# Altium footprint library LukaLIBRARY.PcbLib: 784 footprints (part 8 of 49)
Each footprint in its own frame and in the unit in brackets; x right, y up, seen from the top. Pads: shape width x height; smd on the part's side, far side on the other; paste and mask are expansions set on the pad; w line width, h text height; cw(c..) or ccw(c..) is an arc to the next point about the centre after c.
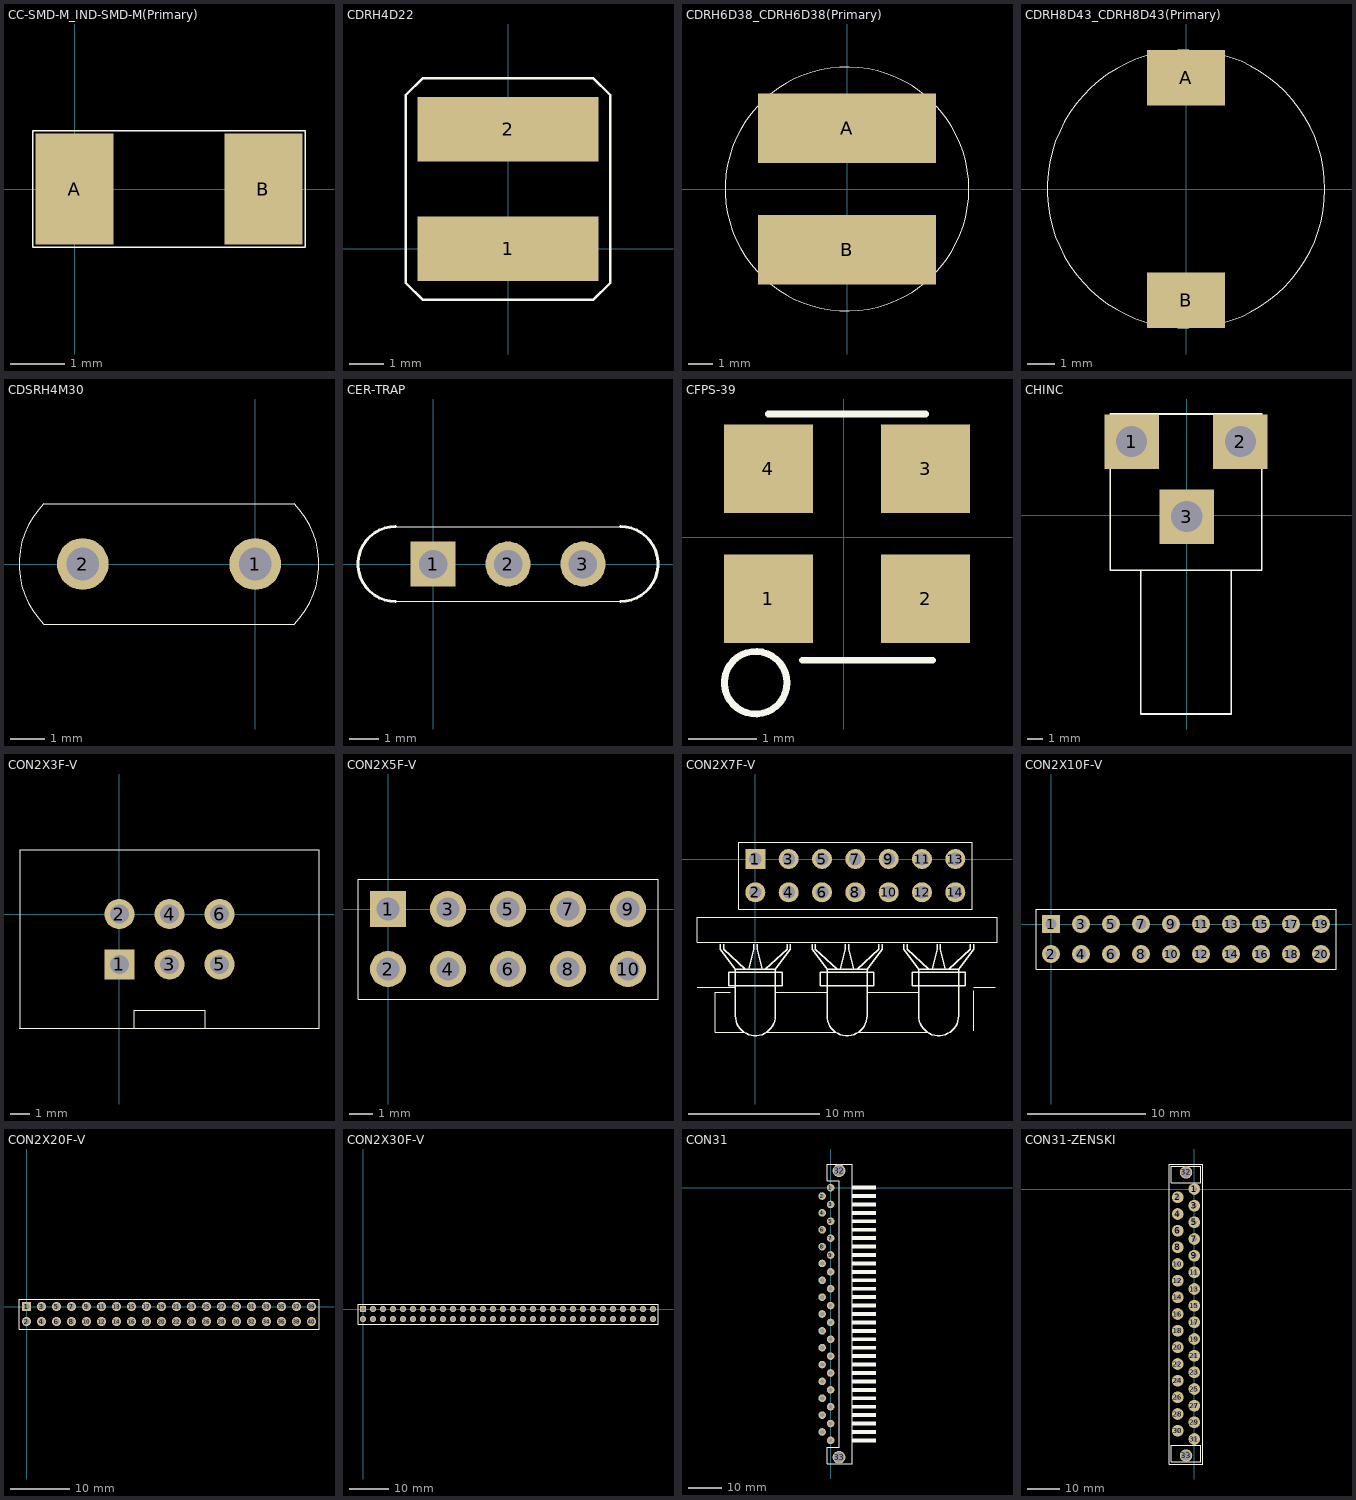
[diagram p7: the footprints below, top view; thin cyan lines are the x and y axes]

## CC-SMD-M_IND-SMD-M(Primary) [mil]
pads (2):
  rect 56x80 smd mask-1000: A(0,0) B(136,0)
Top Overlay:
  lines w1: -30,-42 166,-42 166,42 -30,42 -30,-42
Top Solder:
  region: -28,-40 28,-40 28,40 -28,40
  region: 108,-40 164,-40 164,40 108,40

## CDRH4D22 [mm]
pads (2):
  rect 5.3x1.9 smd mask-25.4: 1(0,0) 2(0,3.5)
Top Overlay:
  lines w0.076: -3,3.5 -3,4.5 -2.5,5 2.5,5 3,4.5 3,4 3,-1 2.5,-1.5 2,-1.5 -2.5,-1.5 -3,-1 -3,4
Top Solder:
  region: -2.65,-0.95 2.65,-0.95 2.65,0.95 -2.65,0.95
  region: -2.65,2.55 2.65,2.55 2.65,4.45 -2.65,4.45

## CDRH6D38_CDRH6D38(Primary) [mm]
pads (2):
  rect 7.3x2.85 smd mask-25.4: A(0,2.5) B(0,-2.5)
Top Overlay:
  circle w0.01: c0,0 r5
Top Solder:
  region: -3.65,1.075 3.65,1.075 3.65,3.925 -3.65,3.925
  region: -3.65,-3.925 3.65,-3.925 3.65,-1.075 -3.65,-1.075

## CDRH8D43_CDRH8D43(Primary) [mm]
pads (2):
  rect 2.8x2 smd mask-25.4: A(0,4) B(0,-4)
Top Overlay:
  circle w0.01: c0,0 r5
Top Solder:
  region: -1.4,-5 1.4,-5 1.4,-3 -1.4,-3
  region: -1.4,3 1.4,3 1.4,5 -1.4,5

## CDSRH4M30 [mil]
pads (2):
  round 60 hole 38: 1(0,0) 2(-200,0)
Top Overlay:
  lines w1: -245,-70 cw(c-175,0) -245,70 45,70 cw(c-25,0) 45,-70 -245,-70

## CER-TRAP [mil]
pads (3):
  rect 60x60 hole 38 mask-1000: 1(0,0)
  round 60 hole 38 mask-1000: 2(100,0) 3(200,0)
Top Overlay:
  lines w1: -50,-50 250,-50 ; -50,50 250,50
  lines w3.94: -50,-50 cw(c-50,0) -50,50 ; 250,-50 ccw(c250,0) 250,50
Top Solder:
  region: 100,30.26 92.17,29.23 84.87,26.2 78.6,21.4 73.8,15.13 70.77,7.83 69.74,0 70.77,-7.83 73.8,-15.13 78.6,-21.4 84.87,-26.2 92.17,-29.23 100,-30.26 107.83,-29.23 115.13,-26.2 121.4,-21.4 126.2,-15.13 129.23,-7.83 130.26,0 129.23,7.83 126.2,15.13 121.4,21.4 115.13,26.2 107.83,29.23
  region: 200,30.26 192.17,29.23 184.87,26.2 178.6,21.4 173.79,15.13 170.77,7.83 169.74,0 170.77,-7.83 173.79,-15.13 178.6,-21.4 184.87,-26.2 192.17,-29.23 200,-30.26 207.83,-29.23 215.13,-26.2 221.4,-21.4 226.21,-15.13 229.23,-7.83 230.26,0 229.23,7.83 226.21,15.13 221.4,21.4 215.13,26.2 207.83,29.23
  region: -30,-30 30,-30 30,30 -30,30
Bottom Solder:
  region: 100,30.26 92.17,29.23 84.87,26.2 78.6,21.4 73.8,15.13 70.77,7.83 69.74,0 70.77,-7.83 73.8,-15.13 78.6,-21.4 84.87,-26.2 92.17,-29.23 100,-30.26 107.83,-29.23 115.13,-26.2 121.4,-21.4 126.2,-15.13 129.23,-7.83 130.26,0 129.23,7.83 126.2,15.13 121.4,21.4 115.13,26.2 107.83,29.23
  region: 200,30.26 192.17,29.23 184.87,26.2 178.6,21.4 173.79,15.13 170.77,7.83 169.74,0 170.77,-7.83 173.79,-15.13 178.6,-21.4 184.87,-26.2 192.17,-29.23 200,-30.26 207.83,-29.23 215.13,-26.2 221.4,-21.4 226.21,-15.13 229.23,-7.83 230.26,0 229.23,7.83 226.21,15.13 221.4,21.4 215.13,26.2 207.83,29.23
  region: -30,-30 30,-30 30,30 -30,30

## CFPS-39 [mm]
pads (4):
  rect 1.3x1.3 smd mask-25.4: 1(-1.1,-0.9) 2(1.2,-0.9) 3(1.2,1) 4(-1.1,1)
Top Overlay:
  circle w0.1: c-1.285,-2.128 r0.457
  lines w0.1: -1.1,1.8 1.2,1.8 ; -0.6,-1.8 1.3,-1.8
Top Solder:
  region: 0.55,-1.55 1.85,-1.55 1.85,-0.25 0.55,-0.25
  region: 0.55,0.35 1.85,0.35 1.85,1.65 0.55,1.65
  region: -1.75,-1.55 -0.45,-1.55 -0.45,-0.25 -1.75,-0.25
  region: -1.75,0.35 -0.45,0.35 -0.45,1.65 -1.75,1.65

## CHINC [mil]
pads (3):
  rect 140x140 hole 80 mask-1000: 1(-141.73,188.98) 2(137.8,188.98) 3(0,-3.94)
Top Layer:
  lines w3.94: 192.91,188.98 192.91,259.84
Top Overlay:
  lines w3.94: -196.85,-141.73 -118.11,-141.73 -118.11,-511.81 114.17,-511.81 114.17,-141.73 192.91,-141.73 ; -196.85,-141.73 -196.85,259.84 192.91,259.84 192.91,-141.73 ; -196.85,-141.73 192.91,-141.73
Top Solder:
  region: -211.73,118.98 -71.73,118.98 -71.73,258.98 -211.73,258.98
  region: -70,-73.94 70,-73.94 70,66.06 -70,66.06
  region: 67.8,118.98 207.8,118.98 207.8,258.98 67.8,258.98
Bottom Solder:
  region: -211.73,118.98 -71.73,118.98 -71.73,258.98 -211.73,258.98
  region: -70,-73.94 70,-73.94 70,66.06 -70,66.06
  region: 67.8,118.98 207.8,118.98 207.8,258.98 67.8,258.98

## CON2X3F-V [mil]
pads (6):
  rect 60x60 hole 38 mask-1000: 1(0,-100)
  round 60 hole 38 mask-1000: 2(0,0) 3(100,-100) 4(100,0) 5(200,-100) 6(200,0)
Top Overlay:
  lines w0.98: -200,-227 398,-227 398,128 -198,128 -198,-227 ; 30,-226 30,-192 171,-192 171,-227
Top Solder:
  region: 100,30.26 92.17,29.23 84.87,26.2 78.6,21.4 73.8,15.13 70.77,7.83 69.74,0 70.77,-7.83 73.8,-15.13 78.6,-21.4 84.87,-26.2 92.17,-29.23 100,-30.26 107.83,-29.23 115.13,-26.2 121.4,-21.4 126.2,-15.13 129.23,-7.83 130.26,0 129.23,7.83 126.2,15.13 121.4,21.4 115.13,26.2 107.83,29.23
  region: 100,-69.74 92.17,-70.77 84.87,-73.8 78.6,-78.6 73.8,-84.87 70.77,-92.17 69.74,-100 70.77,-107.83 73.8,-115.13 78.6,-121.4 84.87,-126.2 92.17,-129.23 100,-130.26 107.83,-129.23 115.13,-126.2 121.4,-121.4 126.2,-115.13 129.23,-107.83 130.26,-100 129.23,-92.17 126.2,-84.87 121.4,-78.6 115.13,-73.8 107.83,-70.77
  region: 200,30.26 192.17,29.23 184.87,26.2 178.6,21.4 173.79,15.13 170.77,7.83 169.74,0 170.77,-7.83 173.79,-15.13 178.6,-21.4 184.87,-26.2 192.17,-29.23 200,-30.26 207.83,-29.23 215.13,-26.2 221.4,-21.4 226.21,-15.13 229.23,-7.83 230.26,0 229.23,7.83 226.21,15.13 221.4,21.4 215.13,26.2 207.83,29.23
  region: 0,30.26 -7.83,29.23 -15.13,26.2 -21.4,21.4 -26.2,15.13 -29.23,7.83 -30.26,0 -29.23,-7.83 -26.2,-15.13 -21.4,-21.4 -15.13,-26.2 -7.83,-29.23 0,-30.26 7.83,-29.23 15.13,-26.2 21.4,-21.4 26.2,-15.13 29.23,-7.83 30.26,0 29.23,7.83 26.2,15.13 21.4,21.4 15.13,26.2 7.83,29.23
  region: 200,-69.74 192.17,-70.77 184.87,-73.8 178.6,-78.6 173.79,-84.87 170.77,-92.17 169.74,-100 170.77,-107.83 173.79,-115.13 178.6,-121.4 184.87,-126.2 192.17,-129.23 200,-130.26 207.83,-129.23 215.13,-126.2 221.4,-121.4 226.21,-115.13 229.23,-107.83 230.26,-100 229.23,-92.17 226.21,-84.87 221.4,-78.6 215.13,-73.8 207.83,-70.77
  region: -30,-130 30,-130 30,-70 -30,-70
Bottom Solder:
  region: 100,30.26 92.17,29.23 84.87,26.2 78.6,21.4 73.8,15.13 70.77,7.83 69.74,0 70.77,-7.83 73.8,-15.13 78.6,-21.4 84.87,-26.2 92.17,-29.23 100,-30.26 107.83,-29.23 115.13,-26.2 121.4,-21.4 126.2,-15.13 129.23,-7.83 130.26,0 129.23,7.83 126.2,15.13 121.4,21.4 115.13,26.2 107.83,29.23
  region: 100,-69.74 92.17,-70.77 84.87,-73.8 78.6,-78.6 73.8,-84.87 70.77,-92.17 69.74,-100 70.77,-107.83 73.8,-115.13 78.6,-121.4 84.87,-126.2 92.17,-129.23 100,-130.26 107.83,-129.23 115.13,-126.2 121.4,-121.4 126.2,-115.13 129.23,-107.83 130.26,-100 129.23,-92.17 126.2,-84.87 121.4,-78.6 115.13,-73.8 107.83,-70.77
  region: 200,30.26 192.17,29.23 184.87,26.2 178.6,21.4 173.79,15.13 170.77,7.83 169.74,0 170.77,-7.83 173.79,-15.13 178.6,-21.4 184.87,-26.2 192.17,-29.23 200,-30.26 207.83,-29.23 215.13,-26.2 221.4,-21.4 226.21,-15.13 229.23,-7.83 230.26,0 229.23,7.83 226.21,15.13 221.4,21.4 215.13,26.2 207.83,29.23
  region: 0,30.26 -7.83,29.23 -15.13,26.2 -21.4,21.4 -26.2,15.13 -29.23,7.83 -30.26,0 -29.23,-7.83 -26.2,-15.13 -21.4,-21.4 -15.13,-26.2 -7.83,-29.23 0,-30.26 7.83,-29.23 15.13,-26.2 21.4,-21.4 26.2,-15.13 29.23,-7.83 30.26,0 29.23,7.83 26.2,15.13 21.4,21.4 15.13,26.2 7.83,29.23
  region: 200,-69.74 192.17,-70.77 184.87,-73.8 178.6,-78.6 173.79,-84.87 170.77,-92.17 169.74,-100 170.77,-107.83 173.79,-115.13 178.6,-121.4 184.87,-126.2 192.17,-129.23 200,-130.26 207.83,-129.23 215.13,-126.2 221.4,-121.4 226.21,-115.13 229.23,-107.83 230.26,-100 229.23,-92.17 226.21,-84.87 221.4,-78.6 215.13,-73.8 207.83,-70.77
  region: -30,-130 30,-130 30,-70 -30,-70

## CON2X5F-V [mil]
pads (10):
  rect 60x60 hole 38 mask-1000: 1(0,0)
  round 60 hole 38 mask-1000: 2(0,-100) 3(100,0) 4(100,-100) 5(200,0) 6(200,-100) 7(300,0) 8(300,-100) 9(400,0) 10(400,-100)
Top Overlay:
  lines w1: -50,-150 450,-150 450,50 -50,50 -50,-150
Top Solder:
  drawing of 10 lines, arcs and shapes, not listed
Bottom Solder:
  drawing of 10 lines, arcs and shapes, not listed

## CON2X7F-V [mil]
pads (14):
  rect 60x60 hole 38 mask-1000: 1(0,0)
  round 60 hole 38 mask-1000: 2(0,-100) 3(100,0) 4(100,-100) 5(200,0) 6(200,-100) 7(300,0) 8(300,-100) 9(400,0) 10(400,-100) 11(500,0) 12(500,-100) 13(600,0) 14(600,-100)
Top Overlay:
  lines w1: -50,-150 -50,50 650,50 650,-150 -50,-150
  lines w3: -175,-385 -60,-385 ; -75,-400 -120,-400 -120,-520 -35,-520 ; 35,-520 240,-520 ; 60,-400 215,-400 ; 310,-520 515,-520 ; 335,-400 490,-400 ; 655,-515 655,-395 ; 655,-385 720,-385 ; -175,-250 -175,-175 725,-175 725,-250 -175,-250
  lines w3.94: -105,-255 -105,-270 -60,-330 ; -95,-255 -95,-270 -30,-330 ; -20,-330 -5,-270 -5,-255 ; 5,-255 5,-270 20,-330 ; 30,-330 95,-270 95,-255 ; 60,-460 60,-330 ; 105,-255 105,-270 60,-330 ; 170,-255 170,-270 215,-330 ; 180,-255 180,-270 245,-330 ; 255,-330 270,-270 270,-255 ; 280,-255 280,-270 295,-330 ; 305,-330 370,-270 370,-255 ; 335,-460 335,-330 ; 380,-255 380,-270 335,-330 ; 445,-255 445,-270 490,-330 ; 455,-255 455,-270 520,-330 ; 530,-330 545,-270 545,-255 ; 555,-255 555,-270 570,-330 ; 580,-330 645,-270 645,-255 ; 610,-460 610,-330 ; 655,-255 655,-270 610,-330 ; -60,-330 -60,-470 ccw(c0,-470) 60,-470 60,-330 ; -60,-330 60,-330 ; 215,-330 215,-470 ccw(c275,-470) 335,-470 335,-330 ; 215,-330 335,-330 ; 490,-330 490,-470 ccw(c550,-470) 610,-470 610,-330 ; 490,-330 610,-330 ; -80,-380 -80,-340 80,-340 80,-380 -80,-380 ; 195,-380 195,-340 355,-340 355,-380 195,-380 ; 470,-380 470,-340 630,-340 630,-380 470,-380
Top Solder:
  drawing of 14 lines, arcs and shapes, not listed
Bottom Solder:
  drawing of 14 lines, arcs and shapes, not listed

## CON2X10F-V [mil]
pads (20):
  rect 60x60 hole 38 mask-1000: 1(0,0)
  round 60 hole 38 mask-1000: 2(0,-100) 3(100,0) 4(100,-100) 5(200,0) 6(200,-100) 7(300,0) 8(300,-100) 9(400,0) 10(400,-100) 11(500,0) 12(500,-100) 13(600,0) 14(600,-100) 15(700,0) 16(700,-100) 17(800,0) 18(800,-100) 19(900,0) 20(900,-100)
Top Overlay:
  lines w1: -50,-150 -50,50 950,50 950,-150 -50,-150
Top Solder:
  drawing of 20 lines, arcs and shapes, not listed
Bottom Solder:
  drawing of 20 lines, arcs and shapes, not listed

## CON2X20F-V [mil]
pads (40):
  rect 60x60 hole 38 mask-1000: 1(0,0)
  round 60 hole 38 mask-1000: 2(0,-100) 3(100,0) 4(100,-100) 5(200,0) 6(200,-100) 7(300,0) 8(300,-100) 9(400,0) 10(400,-100) 11(500,0) 12(500,-100) 13(600,0) 14(600,-100) 15(700,0) 16(700,-100) 17(800,0) 18(800,-100) 19(900,0) 20(900,-100) 21(1000,0) 22(1000,-100) 23(1100,0) 24(1100,-100) 25(1200,0) 26(1200,-100) 27(1300,0) 28(1300,-100) 29(1400,0) 30(1400,-100) 31(1500,0) 32(1500,-100) 33(1600,0) 34(1600,-100) 35(1700,0) 36(1700,-100) 37(1800,0) 38(1800,-100) 39(1900,0) 40(1900,-100)
Top Overlay:
  lines w1: -50,-150 1950,-150 1950,50 -50,50 -50,-150
Top Solder:
  drawing of 40 lines, arcs and shapes, not listed
Bottom Solder:
  drawing of 40 lines, arcs and shapes, not listed

## CON2X30F-V [mil]
pads (60):
  rect 60x60 hole 38 mask-1000: 1(0,0)
  round 60 hole 38 mask-1000: 2(0,-100) 3(100,0) 4(100,-100) 5(200,0) 6(200,-100) 7(300,0) 8(300,-100) 9(400,0) 10(400,-100) 11(500,0) 12(500,-100) 13(600,0) 14(600,-100) 15(700,0) 16(700,-100) 17(800,0) 18(800,-100) 19(900,0) 20(900,-100) 21(1000,0) 22(1000,-100) 23(1100,0) 24(1100,-100) 25(1200,0) 26(1200,-100) 27(1300,0) 28(1300,-100) 29(1400,0) 30(1400,-100) 31(1500,0) 32(1500,-100) 33(1600,0) 34(1600,-100) 35(1700,0) 36(1700,-100) 37(1800,0) 38(1800,-100) 39(1900,0) 40(1900,-100) 41(2000,0) 42(2000,-100) 43(2100,0) 44(2100,-100) 45(2200,0) 46(2200,-100) 47(2300,0) 48(2300,-100) 49(2400,0) 50(2400,-100) 51(2500,0) 52(2500,-100) 53(2600,0) 54(2600,-100) 55(2700,0) 56(2700,-100) 57(2800,0) 58(2800,-100) 59(2900,0) 60(2900,-100)
Top Overlay:
  lines w1: -50,-150 2950,-150 2950,50 -50,50 -50,-150
Top Solder:
  drawing of 60 lines, arcs and shapes, not listed
Bottom Solder:
  drawing of 60 lines, arcs and shapes, not listed

## CON31 [mil]
pads (33):
  round 90 hole 50 mask-1000: 1(0,0) 2(-100,-100) 3(0,-200) 4(-100,-300) 5(0,-400) 6(-100,-500) 7(0,-600) 8(-100,-700) 9(0,-800) 10(-100,-900) 11(0,-1000) 12(-100,-1100) 13(0,-1200) 14(-100,-1300) 15(0,-1400) 16(-100,-1500) 17(0,-1600) 18(-100,-1700) 19(0,-1800) 20(-100,-1900) 21(0,-2000) 22(-100,-2100) 23(0,-2200) 24(-100,-2300) 25(0,-2400) 26(-100,-2500) 27(0,-2600) 28(-100,-2700) 29(0,-2800) 30(-100,-2900) 31(0,-3000)
  round 150 hole 120 mask-1000: 32(100,200) 33(100,-3200)
Top Overlay:
  region: 260,-20 535,-20 535,20 260,20
  region: 260,-320 535,-320 535,-280 260,-280
  region: 260,-620 535,-620 535,-580 260,-580
  region: 260,-920 535,-920 535,-880 260,-880
  region: 260,-1220 535,-1220 535,-1180 260,-1180
  region: 260,-1520 535,-1520 535,-1480 260,-1480
  region: 260,-1820 535,-1820 535,-1780 260,-1780
  region: 260,-2120 535,-2120 535,-2080 260,-2080
  region: 260,-2420 535,-2420 535,-2380 260,-2380
  region: 260,-2720 535,-2720 535,-2680 260,-2680
  region: 260,-3020 535,-3020 535,-2980 260,-2980
  region: 260,-220 535,-220 535,-180 260,-180
  region: 260,-120 535,-120 535,-80 260,-80
  region: 260,-520 535,-520 535,-480 260,-480
  region: 260,-420 535,-420 535,-380 260,-380
  region: 260,-820 535,-820 535,-780 260,-780
  region: 260,-720 535,-720 535,-680 260,-680
  region: 260,-1120 535,-1120 535,-1080 260,-1080
  region: 260,-1020 535,-1020 535,-980 260,-980
  region: 260,-1420 535,-1420 535,-1380 260,-1380
  region: 260,-1320 535,-1320 535,-1280 260,-1280
  region: 260,-1720 535,-1720 535,-1680 260,-1680
  region: 260,-1620 535,-1620 535,-1580 260,-1580
  region: 260,-2020 535,-2020 535,-1980 260,-1980
  region: 260,-1920 535,-1920 535,-1880 260,-1880
  region: 260,-2320 535,-2320 535,-2280 260,-2280
  region: 260,-2220 535,-2220 535,-2180 260,-2180
  region: 260,-2620 535,-2620 535,-2580 260,-2580
  region: 260,-2520 535,-2520 535,-2480 260,-2480
  region: 260,-2920 535,-2920 535,-2880 260,-2880
  region: 260,-2820 535,-2820 535,-2780 260,-2780
  lines w1: -40,-3280 260,-3280 260,280 -40,280 -40,80 100,80 100,-3080 -40,-3080 -40,-3280
Top Solder:
  drawing of 33 lines, arcs and shapes, not listed
Bottom Solder:
  drawing of 33 lines, arcs and shapes, not listed

## CON31-ZENSKI [mil]
pads (33):
  round 140 hole 60 mask-1000: 1(0,0) 2(-200,-100) 3(0,-200) 4(-200,-300) 5(0,-400) 6(-200,-500) 7(0,-600) 8(-200,-700) 9(0,-800) 10(-200,-900) 11(0,-1000) 12(-200,-1100) 13(0,-1200) 14(-200,-1300) 15(0,-1400) 16(-200,-1500) 17(0,-1600) 18(-200,-1700) 19(0,-1800) 20(-200,-1900) 21(0,-2000) 22(-200,-2100) 23(0,-2200) 24(-200,-2300) 25(0,-2400) 26(-200,-2500) 27(0,-2600) 28(-200,-2700) 29(0,-2800) 30(-200,-2900) 31(0,-3000)
  round 150 hole 120 mask-1000: 32(-100,200) 33(-100,-3200)
Top Overlay:
  lines w3: -300,-3300 -300,300 -100,300 100,300 100,-3300 -100,-3300 -300,-3300 ; -275,-3275 -275,-3075 75,-3075 75,-3275 -275,-3275 ; -275,75 -275,275 75,275 75,75 -100,75 -275,75
Top Solder:
  drawing of 33 lines, arcs and shapes, not listed
Bottom Solder:
  drawing of 33 lines, arcs and shapes, not listed